# Altium footprint library Generic Footprint.PcbLib: 160 footprints (part 5 of 20)
Each footprint in its own frame and in the unit in brackets; x right, y up, seen from the top. Pads: shape width x height; smd on the part's side, far side on the other; paste and mask are expansions set on the pad; w line width, h text height; cw(c..) or ccw(c..) is an arc to the next point about the centre after c.
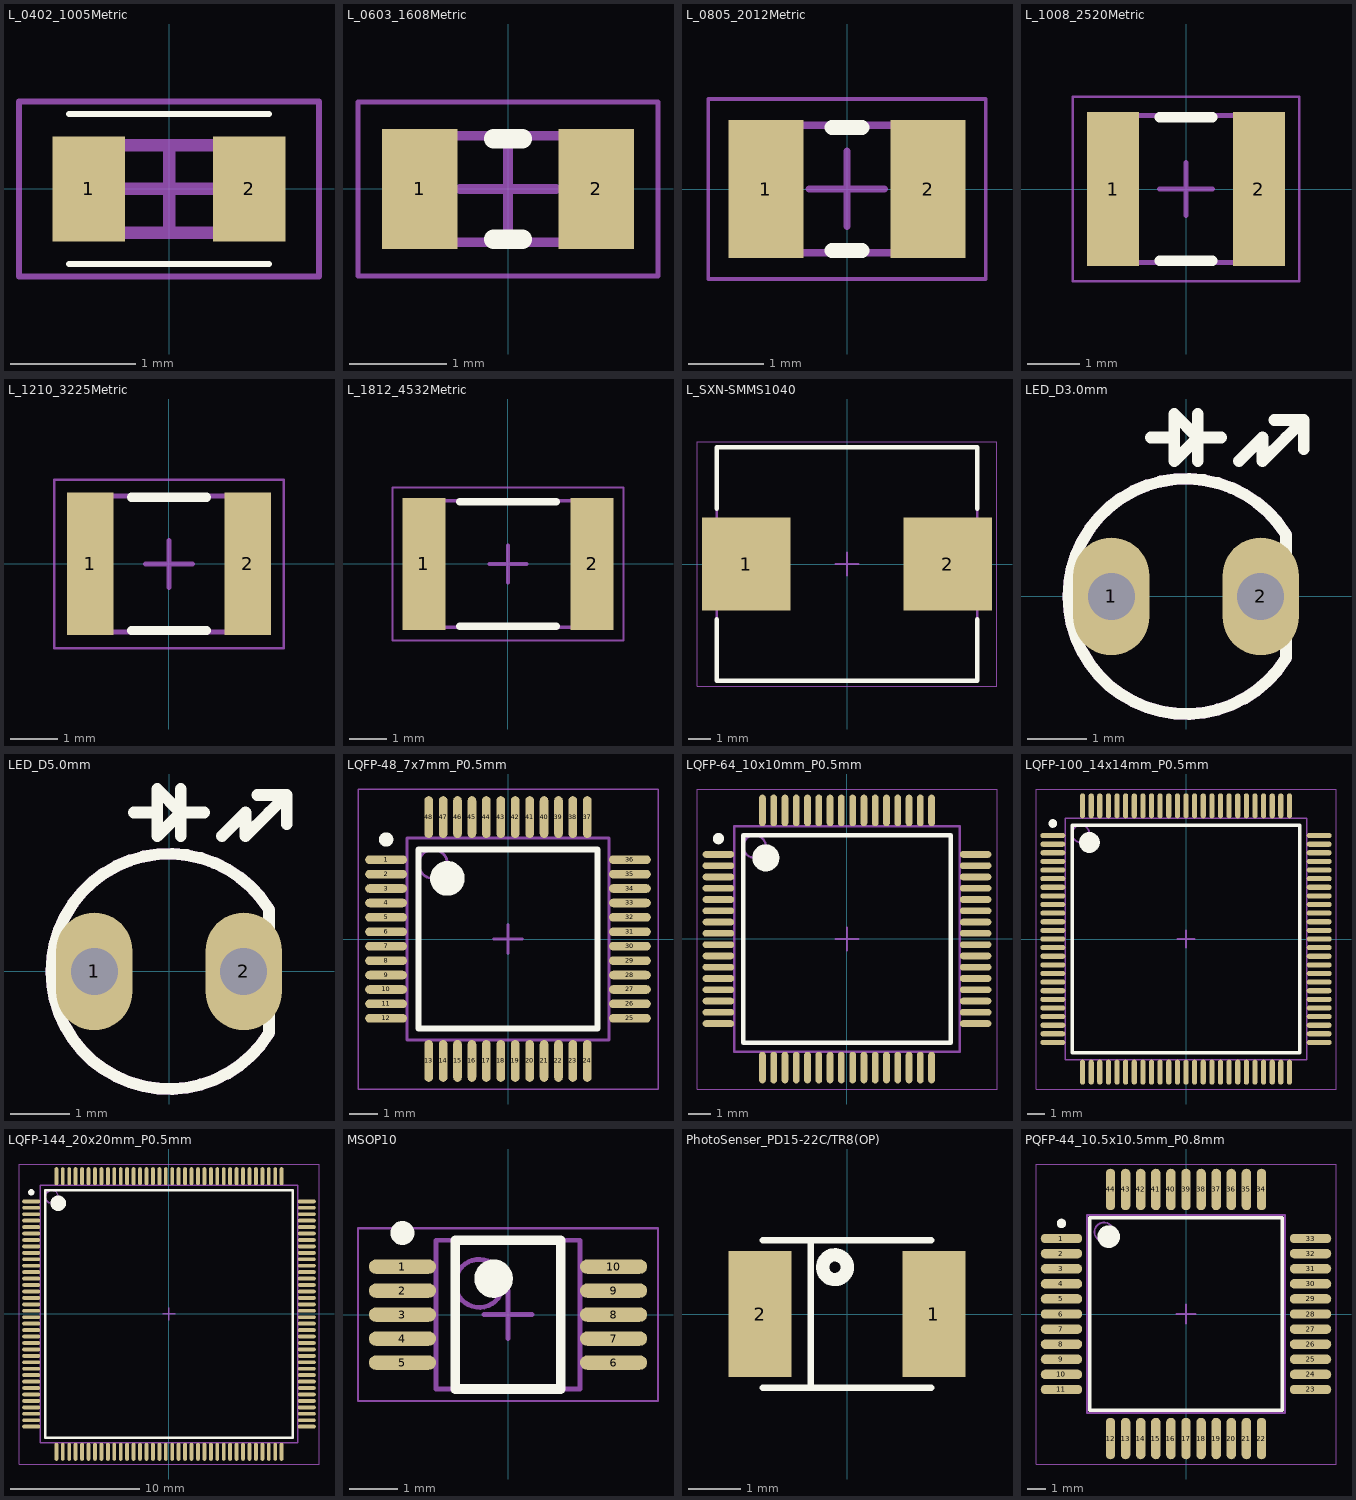
[diagram p4: the footprints below, top view; thin cyan lines are the x and y axes]

## L_0402_1005Metric [mm] "Chip Inductor, 2-Leads, Body 1.30x0.70mm, IPC Medium Density"
height 0.7
pads (2):
  rect 0.58x0.84 smd: 1(-0.64,0) 2(0.64,0)
Top Overlay:
  lines w0.05: -0.8,-0.6 0.8,-0.6 ; -0.8,0.6 0.8,0.6
Courtyard Top:
  lines w0.05: -1.2,-0.7 1.2,-0.7 1.2,0.7 -1.2,0.7 -1.2,-0.7
  lines w0.1: -0.35,0 0.35,0 ; 0,-0.35 0,0.35
Assembly Top:
  lines w0.1: -0.65,-0.35 -0.65,0.35 0.65,0.35 0.65,-0.35 -0.65,-0.35
3D body "L_0402_1005Metric.step": height 0.7, standoff 0, extent -0.65,-0.35 0.65,0.35

## L_0603_1608Metric [mm] "Chip Inductor, 2-Leads, Body 1.78x1.10mm, IPC Medium Density"
height 0.95
pads (2):
  rect 0.78x1.24 smd: 1(-0.91,0) 2(0.91,0)
Top Overlay:
  lines w0.2: -0.15,-0.52 0.15,-0.52 ; -0.15,0.52 0.15,0.52
Courtyard Top:
  lines w0.05: -1.55,-0.9 -1.55,0.9 1.55,0.9 1.55,-0.9 -1.55,-0.9
  lines w0.1: -0.5,0 0.5,0 ; 0,-0.5 0,0.5
Assembly Top:
  lines w0.1: -0.89,-0.55 -0.89,0.55 0.89,0.55 0.89,-0.55 -0.89,-0.55
3D body "L_0603_1608Metric.step": height 0.95, standoff 0, extent -0.89,-0.55 0.89,0.55

## L_0805_2012Metric [mm] "Chip Inductor, 2-Leads, Body 2.30x1.70mm, IPC Medium Density"
height 1.52
pads (2):
  rect 1x1.84 smd: 1(-1.08,0) 2(1.08,0)
Top Overlay:
  lines w0.2: -0.2,-0.82 0.2,-0.82 ; -0.2,0.82 0.2,0.82
Courtyard Top:
  lines w0.05: -1.85,-1.2 -1.85,1.2 1.85,1.2 1.85,-1.2 -1.85,-1.2
  lines w0.1: -0.5,0 0.5,0 ; 0,-0.5 0,0.5
Assembly Top:
  lines w0.1: -1.15,-0.85 -1.15,0.85 1.15,0.85 1.15,-0.85 -1.15,-0.85
3D body "L_0805_2012Metric.step": height 1.52, standoff 0, extent -1.15,-0.85 1.15,0.85

## L_1008_2520Metric [mm] "Chip Inductor, 2-Leads, Body 2.92x2.79mm, IPC Medium Density"
height 2.1
pads (2):
  rect 0.99x2.93 smd: 1(-1.385,0) 2(1.385,0)
Top Overlay:
  lines w0.2: -0.5,-1.365 0.5,-1.365 ; -0.5,1.365 0.5,1.365
Courtyard Top:
  lines w0.05: -2.15,-1.75 2.15,-1.75 2.15,1.75 -2.15,1.75 -2.15,-1.75
  lines w0.1: -0.5,0 0.5,0 ; 0,-0.5 0,0.5
Assembly Top:
  lines w0.1: -1.46,-1.395 1.46,-1.395 1.46,1.395 -1.46,1.395 -1.46,-1.395
3D body "L_1008_2520Metric.step": height 2.1, standoff 0, extent -1.46,-1.395 1.46,1.395

## L_1210_3225Metric [mm] "Chip Inductor, 2-Leads, Body 3.50x2.90mm, IPC Medium Density"
height 2.25
pads (2):
  rect 1x3.04 smd: 1(-1.68,0) 2(1.68,0)
Top Overlay:
  lines w0.2: -0.8,-1.42 0.8,-1.42 ; -0.8,1.42 0.8,1.42
Courtyard Top:
  lines w0.05: -2.45,-1.8 -2.45,1.8 2.45,1.8 2.45,-1.8 -2.45,-1.8
  lines w0.1: -0.5,0 0.5,0 ; 0,-0.5 0,0.5
Assembly Top:
  lines w0.1: -1.75,-1.45 -1.75,1.45 1.75,1.45 1.75,-1.45 -1.75,-1.45
3D body "L_1210_3225Metric.step": height 2.25, standoff 0, extent -1.75,-1.45 1.75,1.45

## L_1812_4532Metric [mm] "Chip Inductor, 2-Leads, Body 4.80x3.40mm, IPC Medium Density"
height 3.15
pads (2):
  rect 1.15x3.54 smd: 1(-2.255,0) 2(2.255,0)
Top Overlay:
  lines w0.2: -1.3,-1.67 1.3,-1.67 ; -1.3,1.67 1.3,1.67
Courtyard Top:
  lines w0.05: -3.1,-2.05 -3.1,2.05 3.1,2.05 3.1,-2.05 -3.1,-2.05
  lines w0.1: -0.5,0 0.5,0 ; 0,-0.5 0,0.5
Assembly Top:
  lines w0.1: -2.4,-1.7 -2.4,1.7 2.4,1.7 2.4,-1.7 -2.4,-1.7
3D body "L_1812_4532Metric.step": height 3.15, standoff 0, extent -2.4,-1.7 2.4,1.7

## L_SXN-SMMS1040 [mm] "Precision Wire Wound Inductor, 2-Leads, Body 11.50x10.00mm, IPC Medium Density"
height 4
pads (2):
  rect 3.9x4.1 smd: 1(-4.45,0) 2(4.45,0)
Top Overlay:
  lines w0.2: -5.75,-2.45 -5.75,-5.15 5.75,-5.15 5.75,-2.45 ; -5.75,2.45 -5.75,5.15 5.75,5.15 5.75,2.45
Courtyard Top:
  lines w0.05: -6.625,-5.4 6.625,-5.4 6.625,5.4 -6.625,5.4 -6.625,-5.4
  lines w0.1: -0.5,0 0.5,0 ; 0,-0.5 0,0.5
Assembly Top:
  lines w0.1: -5.75,-5.15 5.75,-5.15 5.75,5.15 -5.75,5.15 -5.75,-5.15
3D body "L_SXN-1040.step": height 4.1, standoff 0, extent -5.85,-5 5.85,5

## LED_D3.0mm [mm]
pads (2):
  oval 1.3x2 hole 0.8: 1(-1.27,0) 2(1.27,0)
Top Overlay:
  lines w0.2: -0.6,2.7 -0.2,2.7 ; 0.2,2.3 0.2,3.1 ; 0.6,2.7 0.2,2.7 ; 0.9,2.3 1.3,2.7 1.3,2.3 1.7,2.7 2,3 ; 1.5,3 2,3 ; 1.696,-1.06 cw(c0,0) 1.696,1.06 ; 1.702,-1.041 1.702,1.041 ; 2,2.5 2,3 ; 0.2,2.7 -0.2,3.1 -0.2,2.3 0.2,2.7
Assembly Top:
  lines w0.2: 1.696,-1.06 cw(c0,0) 1.696,1.06 ; 1.702,-1.041 1.702,1.041
3D body "LED_D3.0mm.step": height 5.38, standoff -3.17, extent -1.746,-1.988 1.746,2

## LED_D5.0mm [mm]
pads (2):
  oval 1.3x2 hole 0.8: 1(-1.27,0) 2(1.27,0)
Top Overlay:
  lines w0.2: -0.6,2.7 -0.2,2.7 ; 0.2,2.3 0.2,3.1 ; 0.6,2.7 0.2,2.7 ; 0.9,2.3 1.3,2.7 1.3,2.3 1.7,2.7 2,3 ; 1.5,3 2,3 ; 1.696,-1.06 cw(c0,0) 1.696,1.06 ; 1.702,-1.041 1.702,1.041 ; 2,2.5 2,3 ; 0.2,2.7 -0.2,3.1 -0.2,2.3 0.2,2.7
Assembly Top:
  lines w0.2: 1.696,-1.06 cw(c0,0) 1.696,1.06 ; 1.702,-1.041 1.702,1.041
3D body: height 0.25, standoff 0, extent 1.696,-1.06 1.696,-1.06
3D body "LED_D5.0mm.step": height 5.38, standoff -3.17, extent -1.702,-2.057 1.791,1.931
3D body: height 0.25, standoff 0, extent 0,-2 0,-2
3D body: height 0.25, standoff 0, extent 0,-2 0,-2
3D body: height 0.25, standoff 0, extent 0,2 0,2
3D body: height 0.25, standoff 0, extent 0,0 0,0
3D body: height 0.25, standoff 0, extent 2,0 2,0
3D body: height 0.25, standoff 0, extent 1.143,0.178 1.143,0.178

## LQFP-48_7x7mm_P0.5mm [mm] "TSQFP, 48-Leads, Body 7.00x7.00mm, Pitch 0.50mm, IPC Medium Density"
height 1.6
pads (48):
  oval 1.45x0.3 smd: 1(-4.225,2.75) 2(-4.225,2.25) 3(-4.225,1.75) 4(-4.225,1.25) 5(-4.225,0.75) 6(-4.225,0.25) 7(-4.225,-0.25) 8(-4.225,-0.75) 9(-4.225,-1.25) 10(-4.225,-1.75) 11(-4.225,-2.25) 12(-4.225,-2.75) 25(4.225,-2.75) 26(4.225,-2.25) 27(4.225,-1.75) 28(4.225,-1.25) 29(4.225,-0.75) 30(4.225,-0.25) 31(4.225,0.25) 32(4.225,0.75) 33(4.225,1.25) 34(4.225,1.75) 35(4.225,2.25) 36(4.225,2.75)
  oval 0.3x1.45 smd: 13(-2.75,-4.225) 14(-2.25,-4.225) 15(-1.75,-4.225) 16(-1.25,-4.225) 17(-0.75,-4.225) 18(-0.25,-4.225) 19(0.25,-4.225) 20(0.75,-4.225) 21(1.25,-4.225) 22(1.75,-4.225) 23(2.25,-4.225) 24(2.75,-4.225) 37(2.75,4.225) 38(2.25,4.225) 39(1.75,4.225) 40(1.25,4.225) 41(0.75,4.225) 42(0.25,4.225) 43(-0.25,4.225) 44(-0.75,4.225) 45(-1.25,4.225) 46(-1.75,4.225) 47(-2.25,4.225) 48(-2.75,4.225)
Top Overlay:
  circle w0.6: c-2.1,2.1 r0.3
  circle w0.25: c-4.225,3.45 r0.125
  lines w0.2: -3.1,-3.1 3.1,-3.1 3.1,3.1 -3.1,3.1 -3.1,-3.1
Courtyard Top:
  lines w0.05: -5.2,-5.2 5.2,-5.2 5.2,5.2 -5.2,5.2 -5.2,-5.2
  lines w0.1: -0.5,0 0.5,0 ; 0,-0.5 0,0.5
Assembly Top:
  circle w0.1: c-2.6,2.6 r0.5
  lines w0.1: -3.5,-3.5 3.5,-3.5 3.5,3.5 -3.5,3.5 -3.5,-3.5
3D body "LQFP-48_7x7mm_P0.5mm.step": height 1.6, standoff 0, extent -4.5,-4.5 4.5,4.5

## LQFP-64_10x10mm_P0.5mm [mm] "TSQFP, 64-Leads, Body 10.00x10.00mm, Pitch 0.50mm, IPC Medium Density"
height 1.6
pads (64):
  oval 1.4x0.3 smd: 1(-5.7,3.75) 2(-5.7,3.25) 3(-5.7,2.75) 4(-5.7,2.25) 5(-5.7,1.75) 6(-5.7,1.25) 7(-5.7,0.75) 8(-5.7,0.25) 9(-5.7,-0.25) 10(-5.7,-0.75) 11(-5.7,-1.25) 12(-5.7,-1.75) 13(-5.7,-2.25) 14(-5.7,-2.75) 15(-5.7,-3.25) 16(-5.7,-3.75) 33(5.7,-3.75) 34(5.7,-3.25) 35(5.7,-2.75) 36(5.7,-2.25) 37(5.7,-1.75) 38(5.7,-1.25) 39(5.7,-0.75) 40(5.7,-0.25) 41(5.7,0.25) 42(5.7,0.75) 43(5.7,1.25) 44(5.7,1.75) 45(5.7,2.25) 46(5.7,2.75) 47(5.7,3.25) 48(5.7,3.75)
  oval 0.3x1.4 smd: 17(-3.75,-5.7) 18(-3.25,-5.7) 19(-2.75,-5.7) 20(-2.25,-5.7) 21(-1.75,-5.7) 22(-1.25,-5.7) 23(-0.75,-5.7) 24(-0.25,-5.7) 25(0.25,-5.7) 26(0.75,-5.7) 27(1.25,-5.7) 28(1.75,-5.7) 29(2.25,-5.7) 30(2.75,-5.7) 31(3.25,-5.7) 32(3.75,-5.7) 49(3.75,5.7) 50(3.25,5.7) 51(2.75,5.7) 52(2.25,5.7) 53(1.75,5.7) 54(1.25,5.7) 55(0.75,5.7) 56(0.25,5.7) 57(-0.25,5.7) 58(-0.75,5.7) 59(-1.25,5.7) 60(-1.75,5.7) 61(-2.25,5.7) 62(-2.75,5.7) 63(-3.25,5.7) 64(-3.75,5.7)
Top Overlay:
  circle w0.6: c-3.6,3.6 r0.3
  circle w0.25: c-5.7,4.45 r0.125
  lines w0.2: -4.6,-4.6 4.6,-4.6 4.6,4.6 -4.6,4.6 -4.6,-4.6
Courtyard Top:
  lines w0.05: -6.65,-6.65 6.65,-6.65 6.65,6.65 -6.65,6.65 -6.65,-6.65
  lines w0.1: -0.5,0 0.5,0 ; 0,-0.5 0,0.5
Assembly Top:
  circle w0.1: c-4.1,4.1 r0.5
  lines w0.1: -5,-5 5,-5 5,5 -5,5 -5,-5
3D body "LQFP-64_10x10mm_P0.5mm.step": height 1.6, standoff 0, extent -6,-6 6,6

## LQFP-100_14x14mm_P0.5mm [mm] "TSQFP, 100-Leads, Body 14.00x14.00mm, Pitch 0.50mm, IPC Medium Density"
height 1.6
pads (100):
  oval 1.45x0.3 smd: 1(-7.725,6) 2(-7.725,5.5) 3(-7.725,5) 4(-7.725,4.5) 5(-7.725,4) 6(-7.725,3.5) 7(-7.725,3) 8(-7.725,2.5) 9(-7.725,2) 10(-7.725,1.5) 11(-7.725,1) 12(-7.725,0.5) 13(-7.725,0) 14(-7.725,-0.5) 15(-7.725,-1) 16(-7.725,-1.5) 17(-7.725,-2) 18(-7.725,-2.5) 19(-7.725,-3) 20(-7.725,-3.5) 21(-7.725,-4) 22(-7.725,-4.5) 23(-7.725,-5) 24(-7.725,-5.5) 25(-7.725,-6) 51(7.725,-6) 52(7.725,-5.5) 53(7.725,-5) 54(7.725,-4.5) 55(7.725,-4) 56(7.725,-3.5) 57(7.725,-3) 58(7.725,-2.5) 59(7.725,-2) 60(7.725,-1.5) 61(7.725,-1) 62(7.725,-0.5) 63(7.725,0) 64(7.725,0.5) 65(7.725,1) 66(7.725,1.5) 67(7.725,2) 68(7.725,2.5) 69(7.725,3) 70(7.725,3.5) 71(7.725,4) 72(7.725,4.5) 73(7.725,5) 74(7.725,5.5) 75(7.725,6)
  oval 0.3x1.45 smd: 26(-6,-7.725) 27(-5.5,-7.725) 28(-5,-7.725) 29(-4.5,-7.725) 30(-4,-7.725) 31(-3.5,-7.725) 32(-3,-7.725) 33(-2.5,-7.725) 34(-2,-7.725) 35(-1.5,-7.725) 36(-1,-7.725) 37(-0.5,-7.725) 38(0,-7.725) 39(0.5,-7.725) 40(1,-7.725) 41(1.5,-7.725) 42(2,-7.725) 43(2.5,-7.725) 44(3,-7.725) 45(3.5,-7.725) 46(4,-7.725) 47(4.5,-7.725) 48(5,-7.725) 49(5.5,-7.725) 50(6,-7.725) 76(6,7.725) 77(5.5,7.725) 78(5,7.725) 79(4.5,7.725) 80(4,7.725) 81(3.5,7.725) 82(3,7.725) 83(2.5,7.725) 84(2,7.725) 85(1.5,7.725) 86(1,7.725) 87(0.5,7.725) 88(0,7.725) 89(-0.5,7.725) 90(-1,7.725) 91(-1.5,7.725) 92(-2,7.725) 93(-2.5,7.725) 94(-3,7.725) 95(-3.5,7.725) 96(-4,7.725) 97(-4.5,7.725) 98(-5,7.725) 99(-5.5,7.725) 100(-6,7.725)
Top Overlay:
  circle w0.6: c-5.6,5.6 r0.3
  circle w0.25: c-7.725,6.7 r0.125
  lines w0.2: -6.6,-6.6 6.6,-6.6 6.6,6.6 -6.6,6.6 -6.6,-6.6
Courtyard Top:
  lines w0.05: -8.7,-8.7 8.7,-8.7 8.7,8.7 -8.7,8.7 -8.7,-8.7
  lines w0.1: -0.5,0 0.5,0 ; 0,-0.5 0,0.5
Assembly Top:
  circle w0.1: c-6.1,6.1 r0.5
  lines w0.1: -7,-7 7,-7 7,7 -7,7 -7,-7
3D body "LQFP-100_14x14mm_P0.5mm.step": height 1.6, standoff 0, extent -8,-8 8,8

## LQFP-144_20x20mm_P0.5mm [mm] "TSQFP, 144-Leads, Body 20.00x20.00mm, Pitch 0.50mm, IPC Medium Density"
height 1.6
pads (144):
  oval 1.4x0.3 smd: 1(-10.7,8.75) 2(-10.7,8.25) 3(-10.7,7.75) 4(-10.7,7.25) 5(-10.7,6.75) 6(-10.7,6.25) 7(-10.7,5.75) 8(-10.7,5.25) 9(-10.7,4.75) 10(-10.7,4.25) 11(-10.7,3.75) 12(-10.7,3.25) 13(-10.7,2.75) 14(-10.7,2.25) 15(-10.7,1.75) 16(-10.7,1.25) 17(-10.7,0.75) 18(-10.7,0.25) 19(-10.7,-0.25) 20(-10.7,-0.75) 21(-10.7,-1.25) 22(-10.7,-1.75) 23(-10.7,-2.25) 24(-10.7,-2.75) 25(-10.7,-3.25) 26(-10.7,-3.75) 27(-10.7,-4.25) 28(-10.7,-4.75) 29(-10.7,-5.25) 30(-10.7,-5.75) 31(-10.7,-6.25) 32(-10.7,-6.75) 33(-10.7,-7.25) 34(-10.7,-7.75) 35(-10.7,-8.25) 36(-10.7,-8.75) 73(10.7,-8.75) 74(10.7,-8.25) 75(10.7,-7.75) 76(10.7,-7.25) 77(10.7,-6.75) 78(10.7,-6.25) 79(10.7,-5.75) 80(10.7,-5.25) 81(10.7,-4.75) 82(10.7,-4.25) 83(10.7,-3.75) 84(10.7,-3.25) 85(10.7,-2.75) 86(10.7,-2.25) 87(10.7,-1.75) 88(10.7,-1.25) 89(10.7,-0.75) 90(10.7,-0.25) 91(10.7,0.25) 92(10.7,0.75) 93(10.7,1.25) 94(10.7,1.75) 95(10.7,2.25) 96(10.7,2.75) 97(10.7,3.25) 98(10.7,3.75) 99(10.7,4.25) 100(10.7,4.75) 101(10.7,5.25) 102(10.7,5.75) 103(10.7,6.25) 104(10.7,6.75) 105(10.7,7.25) 106(10.7,7.75) 107(10.7,8.25) 108(10.7,8.75)
  oval 0.3x1.4 smd: 37(-8.75,-10.7) 38(-8.25,-10.7) 39(-7.75,-10.7) 40(-7.25,-10.7) 41(-6.75,-10.7) 42(-6.25,-10.7) 43(-5.75,-10.7) 44(-5.25,-10.7) 45(-4.75,-10.7) 46(-4.25,-10.7) 47(-3.75,-10.7) 48(-3.25,-10.7) 49(-2.75,-10.7) 50(-2.25,-10.7) 51(-1.75,-10.7) 52(-1.25,-10.7) 53(-0.75,-10.7) 54(-0.25,-10.7) 55(0.25,-10.7) 56(0.75,-10.7) 57(1.25,-10.7) 58(1.75,-10.7) 59(2.25,-10.7) 60(2.75,-10.7) 61(3.25,-10.7) 62(3.75,-10.7) 63(4.25,-10.7) 64(4.75,-10.7) 65(5.25,-10.7) 66(5.75,-10.7) 67(6.25,-10.7) 68(6.75,-10.7) 69(7.25,-10.7) 70(7.75,-10.7) 71(8.25,-10.7) 72(8.75,-10.7) 109(8.75,10.7) 110(8.25,10.7) 111(7.75,10.7) 112(7.25,10.7) 113(6.75,10.7) 114(6.25,10.7) 115(5.75,10.7) 116(5.25,10.7) 117(4.75,10.7) 118(4.25,10.7) 119(3.75,10.7) 120(3.25,10.7) 121(2.75,10.7) 122(2.25,10.7) 123(1.75,10.7) 124(1.25,10.7) 125(0.75,10.7) 126(0.25,10.7) 127(-0.25,10.7) 128(-0.75,10.7) 129(-1.25,10.7) 130(-1.75,10.7) 131(-2.25,10.7) 132(-2.75,10.7) 133(-3.25,10.7) 134(-3.75,10.7) 135(-4.25,10.7) 136(-4.75,10.7) 137(-5.25,10.7) 138(-5.75,10.7) 139(-6.25,10.7) 140(-6.75,10.7) 141(-7.25,10.7) 142(-7.75,10.7) 143(-8.25,10.7) 144(-8.75,10.7)
Top Overlay:
  circle w0.25: c-10.7,9.45 r0.125
  circle w0.6: c-8.6,8.6 r0.3
  lines w0.2: -9.6,-9.6 -9.6,9.6 9.6,9.6 9.6,-9.6 -9.6,-9.6
Courtyard Top:
  lines w0.05: -11.65,-11.65 -11.65,11.65 11.65,11.65 11.65,-11.65 -11.65,-11.65
  lines w0.1: -0.5,0 0.5,0 ; 0,-0.5 0,0.5
Assembly Top:
  circle w0.1: c-9.1,9.1 r0.5
  lines w0.1: -10,-10 -10,10 10,10 10,-10 -10,-10
3D body "LQFP-144_20x20mm_P0.5mm.step": height 1.6, standoff 0, extent -11,-11 11,11

## MSOP10 [mm]
height 1.1
pads (10):
  oval 1.4x0.3 smd: 1(-2.2,1) 2(-2.2,0.5) 3(-2.2,0) 4(-2.2,-0.5) 5(-2.2,-1) 6(2.2,-1) 7(2.2,-0.5) 8(2.2,0) 9(2.2,0.5) 10(2.2,1)
Top Overlay:
  circle w0.4: c-0.3,0.75 r0.2
  circle w0.25: c-2.2,1.7 r0.125
  lines w0.2: -1.1,-1.55 1.1,-1.55 1.1,1.55 -1.1,1.55 -1.1,-1.55
Courtyard Top:
  lines w0.05: -3.125,-1.8 3.125,-1.8 3.125,1.8 -3.125,1.8 -3.125,-1.8
  lines w0.1: -0.5,0 0.5,0 ; 0,-0.5 0,0.5
Assembly Top:
  circle w0.1: c-0.6,0.65 r0.5
  lines w0.1: -1.5,-1.55 1.5,-1.55 1.5,1.55 -1.5,1.55 -1.5,-1.55
3D body: height 1.1, standoff 0.15, extent -1.5,-1.55 1.5,1.55

## PhotoSenser_PD15-22C/TR8(OP) [mm]
pads (2):
  rect 1.2x2.4 smd: 1(1.65,0) 2(-1.65,0)
Top Overlay:
  circle w0.254: c-0.229,0.889 r0.234
  lines w0.127: -1.6,-1.4 1.6,-1.4 ; -1.6,1.4 1.6,1.4 ; -0.686,-1.397 -0.686,1.397

## PQFP-44_10.5x10.5mm_P0.8mm [mm] "QFP, 44-Leads, Body 10.50x10.50mm, Pitch 0.80mm, IPC Medium Density"
height 2.25
pads (44):
  oval 2.2x0.5 smd: 1(-6.6,4) 2(-6.6,3.2) 3(-6.6,2.4) 4(-6.6,1.6) 5(-6.6,0.8) 6(-6.6,0) 7(-6.6,-0.8) 8(-6.6,-1.6) 9(-6.6,-2.4) 10(-6.6,-3.2) 11(-6.6,-4) 23(6.6,-4) 24(6.6,-3.2) 25(6.6,-2.4) 26(6.6,-1.6) 27(6.6,-0.8) 28(6.6,0) 29(6.6,0.8) 30(6.6,1.6) 31(6.6,2.4) 32(6.6,3.2) 33(6.6,4)
  oval 0.5x2.2 smd: 12(-4,-6.6) 13(-3.2,-6.6) 14(-2.4,-6.6) 15(-1.6,-6.6) 16(-0.8,-6.6) 17(0,-6.6) 18(0.8,-6.6) 19(1.6,-6.6) 20(2.4,-6.6) 21(3.2,-6.6) 22(4,-6.6) 34(4,6.6) 35(3.2,6.6) 36(2.4,6.6) 37(1.6,6.6) 38(0.8,6.6) 39(0,6.6) 40(-0.8,6.6) 41(-1.6,6.6) 42(-2.4,6.6) 43(-3.2,6.6) 44(-4,6.6)
Top Overlay:
  circle w0.6: c-4.1,4.1 r0.3
  circle w0.25: c-6.6,4.8 r0.125
  lines w0.2: -5.1,-5.1 5.1,-5.1 5.1,5.1 -5.1,5.1 -5.1,-5.1
Courtyard Top:
  lines w0.05: -7.95,-7.95 7.95,-7.95 7.95,7.95 -7.95,7.95 -7.95,-7.95
  lines w0.1: -0.5,0 0.5,0 ; 0,-0.5 0,0.5
Assembly Top:
  circle w0.1: c-4.35,4.35 r0.5
  lines w0.1: -5.25,-5.25 5.25,-5.25 5.25,5.25 -5.25,5.25 -5.25,-5.25
3D body "PQFP-44_10.5x10.5mm_P0.8mm.step": height 2.25, standoff 0, extent -7.25,-7.25 7.25,7.25